# Altium footprint library PcbLib1.PcbLib: 120 footprints (part 3 of 8)
Each footprint in its own frame and in the unit in brackets; x right, y up, seen from the top. Pads: shape width x height; smd on the part's side, far side on the other; paste and mask are expansions set on the pad; w line width, h text height; cw(c..) or ccw(c..) is an arc to the next point about the centre after c.
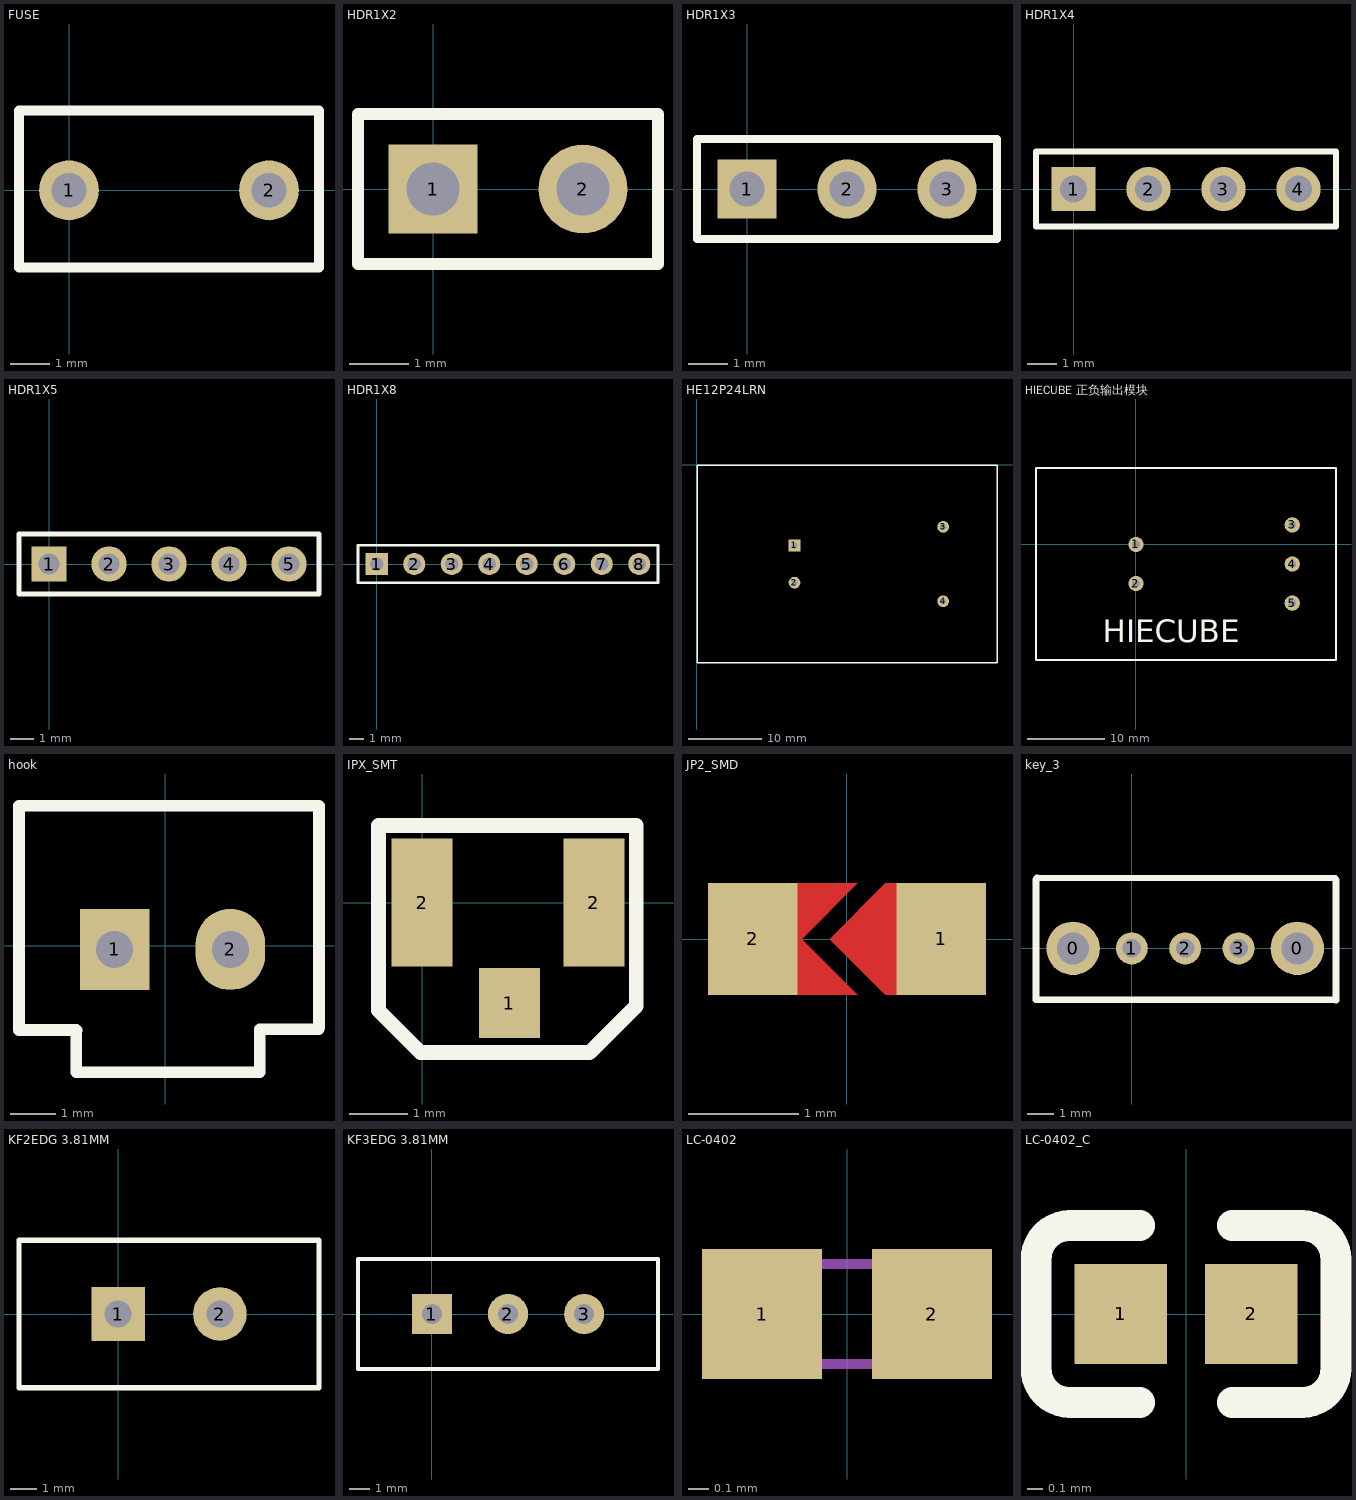
[diagram p2: the footprints below, top view; thin cyan lines are the x and y axes]

## FUSE [mil]
pads (2):
  round 60 hole 34.65: 1(0,0) 2(200,0)
Top Overlay:
  lines w10: -50,-77.48 250,-77.48 250,80 -50,80 -50,-77.48

## HDR1X2 [mm]
pads (2):
  rect 1.5x1.5 hole 0.9: 1(0,0)
  round 1.5 hole 0.9: 2(2.54,0)
Top Overlay:
  lines w0.2: -1.27,-1.27 3.81,-1.27 3.81,1.27 -1.27,1.27 -1.27,-1.27

## HDR1X3 [mm]
pads (3):
  rect 1.5x1.5 hole 0.9: 1(0,0)
  round 1.5 hole 0.9: 2(2.54,0) 3(5.08,0)
Top Overlay:
  lines w0.2: -1.27,-1.27 -1.27,1.27 6.35,1.27 6.35,-1.27 -1.27,-1.27

## HDR1X4 [mm]
pads (4):
  rect 1.5x1.5 hole 0.9: 1(0,0)
  round 1.5 hole 0.9: 2(2.54,0) 3(5.08,0) 4(7.62,0)
Top Overlay:
  lines w0.2: -1.27,-1.27 -1.27,1.27 8.89,1.27 8.89,-1.27 -1.27,-1.27

## HDR1X5 [mm]
pads (5):
  rect 1.5x1.5 hole 0.9: 1(0,0)
  round 1.5 hole 0.9: 2(2.54,0) 3(5.08,0) 4(7.62,0) 5(10.16,0)
Top Overlay:
  lines w0.2: -1.27,-1.27 11.43,-1.27 11.43,1.27 -1.27,1.27 -1.27,-1.27

## HDR1X8 [mm]
pads (8):
  rect 1.5x1.5 hole 0.9: 1(0,0)
  round 1.5 hole 0.9: 2(2.54,0) 3(5.08,0) 4(7.62,0) 5(10.16,0) 6(12.7,0) 7(15.24,0) 8(17.78,0)
Top Overlay:
  lines w0.2: -1.27,-1.27 -1.27,1.27 19.05,1.27 19.05,-1.27 -1.27,-1.27

## HE12P24LRN [mm]
pads (4):
  rect 1.6x1.6 hole 0.8: 1(13.32,-11.02)
  round 1.6 hole 0.8: 2(13.32,-16.1) 3(33.64,-8.48) 4(33.64,-18.64)
Top Overlay:
  lines w0.2: 0,-27.05 0,-0.05 41,-0.05 41,-27.05 0,-27.05

## HIECUBE 正负输出模块 [mm]
pads (5):
  round 2 hole 1: 1(0,0) 2(0,-5.08) 3(20.32,2.54) 4(20.32,-2.54) 5(20.32,-7.62)
Top Overlay:
  lines w0.254: -13,-15.04 26,-15.04 26,9.96 -13,9.96 -13,-15.04
  text "HIECUBE" at -4.318,-13.716 h5

## hook [mil]
pads (2):
  rect 60x70 hole 32: 1(-43.67,-3.08)
  oval 60x70 hole 32: 2(56.33,-3.08)
Top Overlay:
  lines w10: -76.93,-72.69 -126.28,-72.69 -126.28,120.96 132.66,120.96 ; -76.36,-72.97 -76.64,-73.26 -76.64,-109.12 81.74,-109.12 81.74,-71.98 132.58,-71.98 ; 132.92,-70.5 132.92,120.87

## IPX_SMT [mm] "IPX"
height 2
pads (3):
  rect 1.05x1.2 smd: 1(1.5,-1.725)
  rect 1.05x2.2 smd: 2(0,0) 2(2.95,0)
Top Overlay:
  lines w0.254: -0.75,-1.85 -0.75,1.325 3.675,1.325 3.675,-1.775 2.875,-2.575 -0.025,-2.575 -0.75,-1.85

## JP2_SMD [mil]
height 78.74
pads (2):
  rect 32x40 smd: 1(33.75,0) 2(-33.75,0)
Top Layer:
  region: 23.75,20 13.75,20 -6.25,0 13.75,-20 23.75,-20
  region: -26.25,0 -16.25,0 3.75,20 -26.25,20
  region: -26.25,0 -16.25,0 3.75,-20 -26.25,-20
Top Paste:
  region: 23.75,20 13.75,20 -6.25,0 13.75,-20 23.75,-20
  region: -26.25,0 -16.25,0 3.75,20 -26.25,20
  region: -26.25,0 -16.25,0 3.75,-20 -26.25,-20
Top Solder:
  region: 23.75,24 13.75,24 -10.25,0 13.75,-24 23.75,-24
  region: -26.25,0 -12.25,0 11.75,24 -26.25,24
  region: -26.25,0 -12.25,0 11.75,-24 -26.25,-24

## key_3 [mm]
pads (5):
  round 2 hole 1.2: 0(-2.2,0) 0(6.2,0)
  round 1.2 hole 0.7: 1(0,0) 2(2,0) 3(4,0)
Top Overlay:
  lines w0.254: -3.589,-1.925 -3.589,2.575 ; -3.548,2.641 7.621,2.624 ; -3.547,-1.926 7.648,-1.926 ; 7.648,-1.939 7.648,2.561

## KF2EDG 3.81MM [mm] "KF2EDG 3.81MM"
height 10
pads (2):
  rect 2x2 hole 1: 1(0,0)
  round 2 hole 1: 2(3.81,0)
Top Overlay:
  lines w0.2: -3.7,-2.75 7.51,-2.75 7.51,2.75 -3.7,2.75 -3.7,-2.75

## KF3EDG 3.81MM [mm] "KF2EDG 3.81MM"
height 10
pads (3):
  rect 2x2 hole 1: 1(0,0)
  round 2 hole 1: 2(3.81,0) 3(7.62,0)
Top Overlay:
  lines w0.2: -3.7,-2.75 -3.7,2.75 11.32,2.75 11.32,-2.75 -3.7,-2.75

## LC-0402 [mm]
pads (2):
  rect 0.6x0.65 smd mask+0.051: 1(-0.425,0) 2(0.425,0)
Mechanical 13:
  lines w0.05: -0.5,-0.25 -0.5,0.25 0.5,0.25 0.5,-0.25 -0.5,-0.25

## LC-0402_C [mm]
pads (2):
  rect 0.6x0.65 smd mask+0.051: 1(-0.425,0) 2(0.425,0)
Top Overlay:
  lines w0.2: -0.755,-0.575 cw(c-0.755,-0.355) -0.975,-0.355 -0.975,0.355 cw(c-0.755,0.355) -0.755,0.575 ; -0.75,-0.575 -0.3,-0.575 ; -0.75,0.575 -0.3,0.575 ; 0.3,-0.575 0.75,-0.575 ; 0.3,0.575 0.75,0.575 ; 0.755,-0.575 ccw(c0.755,-0.355) 0.975,-0.355 0.975,0.355 ccw(c0.755,0.355) 0.755,0.575
3D body "0402 SMD Capacitor.step": height 0.2, standoff 0, extent -0.483,-0.3 0.518,0.3